# Altium schematic symbol library jlcpcb_2025_04_capacitors_extended_0603.schlib: 3668 symbols (part 17 of 20) (continued)
## GRM1885C1H112JA01D
designator C?  Capacitance: 1.1nF  (hidden comment: *)
Capacitor, Ceramic (MLCC), 1.1nF, ±5%, 50V, C0G, ±5%, SMD 0603; Manufacturer: Murata Electronics; Manufacturer Part Number: GRM1885C1H112JA01D; Package Size: 0603; JLCPCB Basic Part: No; JLCPCB Part Number: C710889; Supplier 1: LCSC; Category: Capacitors - MLCC; Supplier Part Number 1: C710889; Tolerance: ±5%; Voltage Rating: 50V; Temperature Coefficient: C0G; RoHS: Yes; ComponentLink1Description: Datasheet; ComponentLink1URL: https://wmsc.lcsc.com/wmsc/upload/file/pdf/v2/lcsc/2308111812_Murata-Electronics-GRM1885C1H112JA01D_C710889.pdf; ComponentLink2Description: JLCPCB Part URL; ComponentLink2URL: https://jlcpcb.com/partdetail/C710889; ComponentLink3Description: LCSC Part URL; ComponentLink3URL: https://lcsc.com/product-detail/Multilayer-Ceramic-Capacitors-MLCC---SMD-SMT_Murata-Electronics-Murata-Electronics-GRM1885C1H112JA01D_C710889.html
footprint CAP-0603 (0603 (1608M) Capacitor)
pins: 1, 2

## GRM1885C1H120FA01D
designator C?  Capacitance: 12pF  (hidden comment: *)
Capacitor, Ceramic (MLCC), 12pF, ±1%, 50V, C0G, ±1%, SMD 0603; Manufacturer: Murata Electronics; Manufacturer Part Number: GRM1885C1H120FA01D; Package Size: 0603; JLCPCB Basic Part: No; JLCPCB Part Number: C882527; Supplier 1: LCSC; Category: Capacitors - MLCC; Supplier Part Number 1: C882527; Tolerance: ±1%; Voltage Rating: 50V; Temperature Coefficient: C0G; RoHS: Yes; ComponentLink1Description: Datasheet; ComponentLink1URL: https://wmsc.lcsc.com/wmsc/upload/file/pdf/v2/lcsc/2206281830_Murata-Electronics-GRM1885C1H120FA01D_C882527.pdf; ComponentLink2Description: JLCPCB Part URL; ComponentLink2URL: https://jlcpcb.com/partdetail/C882527; ComponentLink3Description: LCSC Part URL; ComponentLink3URL: https://lcsc.com/product-detail/Multilayer-Ceramic-Capacitors-MLCC---SMD-SMT_Murata-Electronics-Murata-Electronics-GRM1885C1H120FA01D_C882527.html
footprint CAP-0603 (0603 (1608M) Capacitor)
pins: 1, 2

## GRM1885C1H120GA01D
designator C?  Capacitance: 12pF  (hidden comment: *)
Capacitor, Ceramic (MLCC), 12pF, ±2%, 50V, C0G, ±2%, SMD 0603; Manufacturer: Murata Electronics; Manufacturer Part Number: GRM1885C1H120GA01D; Package Size: 0603; JLCPCB Basic Part: No; JLCPCB Part Number: C426329; Supplier 1: LCSC; Category: Capacitors - MLCC; Supplier Part Number 1: C426329; Tolerance: ±2%; Voltage Rating: 50V; Temperature Coefficient: C0G; RoHS: Yes; ComponentLink1Description: Datasheet; ComponentLink1URL: https://wmsc.lcsc.com/wmsc/upload/file/pdf/v2/lcsc/2304140030_Murata-Electronics-GRM1885C1H120GA01D_C426329.pdf; ComponentLink2Description: JLCPCB Part URL; ComponentLink2URL: https://jlcpcb.com/partdetail/C426329; ComponentLink3Description: LCSC Part URL; ComponentLink3URL: https://lcsc.com/product-detail/Multilayer-Ceramic-Capacitors-MLCC---SMD-SMT_Murata-Electronics-Murata-Electronics-GRM1885C1H120GA01D_C426329.html
footprint CAP-0603 (0603 (1608M) Capacitor)
pins: 1, 2

## GRM1885C1H121GA01D
designator C?  Capacitance: 120pF  (hidden comment: *)
Capacitor, Ceramic (MLCC), 120pF, ±2%, null, null, ±2%, SMD 0603; Manufacturer: Murata Electronics; Manufacturer Part Number: GRM1885C1H121GA01D; Package Size: 0603; JLCPCB Basic Part: No; JLCPCB Part Number: C907973; Supplier 1: LCSC; Category: Capacitors - MLCC; Supplier Part Number 1: C907973; Tolerance: ±2%; Voltage Rating: null; Temperature Coefficient: null; RoHS: Yes; ComponentLink1Description: Datasheet; ComponentLink1URL: https://wmsc.lcsc.com/wmsc/upload/file/pdf/v2/lcsc/2201242100_Murata-Electronics-GRM1885C1H121GA01D_C907973.pdf; ComponentLink2Description: JLCPCB Part URL; ComponentLink2URL: https://jlcpcb.com/partdetail/C907973; ComponentLink3Description: LCSC Part URL; ComponentLink3URL: https://lcsc.com/product-detail/Multilayer-Ceramic-Capacitors-MLCC---SMD-SMT_Murata-Electronics-Murata-Electronics-GRM1885C1H121GA01D_C907973.html
footprint CAP-0603 (0603 (1608M) Capacitor)
pins: 1, 2

## GRM1885C1H121JA01D
designator C?  Capacitance: 120pF  (hidden comment: *)
Capacitor, Ceramic (MLCC), 120pF, ±5%, 50V, C0G, ±5%, SMD 0603; Manufacturer: Murata Electronics; Manufacturer Part Number: GRM1885C1H121JA01D; Package Size: 0603; JLCPCB Basic Part: No; JLCPCB Part Number: C85974; Supplier 1: LCSC; Category: Capacitors - MLCC; Supplier Part Number 1: C85974; Tolerance: ±5%; Voltage Rating: 50V; Temperature Coefficient: C0G; RoHS: Yes; ComponentLink1Description: Datasheet; ComponentLink1URL: https://wmsc.lcsc.com/wmsc/upload/file/pdf/v2/lcsc/2304140030_Murata-Electronics-GRM1885C1H121JA01D_C85974.pdf; ComponentLink2Description: JLCPCB Part URL; ComponentLink2URL: https://jlcpcb.com/partdetail/C85974; ComponentLink3Description: LCSC Part URL; ComponentLink3URL: https://lcsc.com/product-detail/Multilayer-Ceramic-Capacitors-MLCC---SMD-SMT_Murata-Electronics-Murata-Electronics-GRM1885C1H121JA01D_C85974.html
footprint CAP-0603 (0603 (1608M) Capacitor)
pins: 1, 2

## GRM1885C1H122JA01D
designator C?  Capacitance: 1.2nF  (hidden comment: *)
Capacitor, Ceramic (MLCC), 1.2nF, ±5%, 50V, C0G, ±5%, SMD 0603; Manufacturer: Murata Electronics; Manufacturer Part Number: GRM1885C1H122JA01D; Package Size: 0603; JLCPCB Basic Part: No; JLCPCB Part Number: C97876; Supplier 1: LCSC; Category: Capacitors - MLCC; Supplier Part Number 1: C97876; Tolerance: ±5%; Voltage Rating: 50V; Temperature Coefficient: C0G; RoHS: Yes; ComponentLink1Description: Datasheet; ComponentLink1URL: https://wmsc.lcsc.com/wmsc/upload/file/pdf/v2/lcsc/2304140030_Murata-Electronics-GRM1885C1H122JA01D_C97876.pdf; ComponentLink2Description: JLCPCB Part URL; ComponentLink2URL: https://jlcpcb.com/partdetail/C97876; ComponentLink3Description: LCSC Part URL; ComponentLink3URL: https://lcsc.com/product-detail/Multilayer-Ceramic-Capacitors-MLCC---SMD-SMT_Murata-Electronics-Murata-Electronics-GRM1885C1H122JA01D_C97876.html
footprint CAP-0603 (0603 (1608M) Capacitor)
pins: 1, 2

## GRM1885C1H131JA01D
designator C?  Capacitance: 130pF  (hidden comment: *)
Capacitor, Ceramic (MLCC), 130pF, ±5%, 50V, C0G, ±5%, SMD 0603; Manufacturer: Murata Electronics; Manufacturer Part Number: GRM1885C1H131JA01D; Package Size: 0603; JLCPCB Basic Part: No; JLCPCB Part Number: C441737; Supplier 1: LCSC; Category: Capacitors - MLCC; Supplier Part Number 1: C441737; Tolerance: ±5%; Voltage Rating: 50V; Temperature Coefficient: C0G; RoHS: Yes; ComponentLink1Description: Datasheet; ComponentLink1URL: https://wmsc.lcsc.com/wmsc/upload/file/pdf/v2/lcsc/2304140030_Murata-Electronics-GRM1885C1H131JA01D_C441737.pdf; ComponentLink2Description: JLCPCB Part URL; ComponentLink2URL: https://jlcpcb.com/partdetail/C441737; ComponentLink3Description: LCSC Part URL; ComponentLink3URL: https://lcsc.com/product-detail/Multilayer-Ceramic-Capacitors-MLCC---SMD-SMT_Murata-Electronics-Murata-Electronics-GRM1885C1H131JA01D_C441737.html
footprint CAP-0603 (0603 (1608M) Capacitor)
pins: 1, 2

## GRM1885C1H132JA01D
designator C?  Capacitance: 1.3nF  (hidden comment: *)
Capacitor, Ceramic (MLCC), 1.3nF, ±5%, 50V, null, ±5%, SMD 0603; Manufacturer: Murata Electronics; Manufacturer Part Number: GRM1885C1H132JA01D; Package Size: 0603; JLCPCB Basic Part: No; JLCPCB Part Number: C185598; Supplier 1: LCSC; Category: Capacitors - MLCC; Supplier Part Number 1: C185598; Tolerance: ±5%; Voltage Rating: 50V; Temperature Coefficient: null; RoHS: Yes; ComponentLink1Description: Datasheet; ComponentLink1URL: https://wmsc.lcsc.com/wmsc/upload/file/pdf/v2/lcsc/2304140030_Murata-Electronics-GRM1885C1H132JA01D_C185598.pdf; ComponentLink2Description: JLCPCB Part URL; ComponentLink2URL: https://jlcpcb.com/partdetail/C185598; ComponentLink3Description: LCSC Part URL; ComponentLink3URL: https://lcsc.com/product-detail/Multilayer-Ceramic-Capacitors-MLCC---SMD-SMT_Murata-Electronics-Murata-Electronics-GRM1885C1H132JA01D_C185598.html
footprint CAP-0603 (0603 (1608M) Capacitor)
pins: 1, 2

## GRM1885C1H150JA01D
designator C?  Capacitance: 15pF  (hidden comment: *)
Capacitor, Ceramic (MLCC), 15pF, ±5%, 50V, C0G, ±5%, SMD 0603; Manufacturer: Murata Electronics; Manufacturer Part Number: GRM1885C1H150JA01D; Package Size: 0603; JLCPCB Basic Part: No; JLCPCB Part Number: C71651; Supplier 1: LCSC; Category: Capacitors - MLCC; Supplier Part Number 1: C71651; Tolerance: ±5%; Voltage Rating: 50V; Temperature Coefficient: C0G; RoHS: Yes; ComponentLink1Description: Datasheet; ComponentLink1URL: https://wmsc.lcsc.com/wmsc/upload/file/pdf/v2/lcsc/1811122015_Murata-Electronics-GRM1885C1H150JA01D_C71651.pdf; ComponentLink2Description: JLCPCB Part URL; ComponentLink2URL: https://jlcpcb.com/partdetail/C71651; ComponentLink3Description: LCSC Part URL; ComponentLink3URL: https://lcsc.com/product-detail/Multilayer-Ceramic-Capacitors-MLCC---SMD-SMT_Murata-Electronics-Murata-Electronics-GRM1885C1H150JA01D_C71651.html
footprint CAP-0603 (0603 (1608M) Capacitor)
pins: 1, 2

## GRM1885C1H151GA01D
designator C?  Capacitance: 150pF  (hidden comment: *)
Capacitor, Ceramic (MLCC), 150pF, ±2%, 50V, C0G, ±2%, SMD 0603; Manufacturer: Murata Electronics; Manufacturer Part Number: GRM1885C1H151GA01D; Package Size: 0603; JLCPCB Basic Part: No; JLCPCB Part Number: C3869296; Supplier 1: LCSC; Category: Capacitors - MLCC; Supplier Part Number 1: C3869296; Tolerance: ±2%; Voltage Rating: 50V; Temperature Coefficient: C0G; RoHS: Yes; ComponentLink1Description: Datasheet; ComponentLink1URL: https://wmsc.lcsc.com/wmsc/upload/file/pdf/v2/lcsc/2401250435_Murata-Electronics-GRM1885C1H151GA01D_C3869296.pdf; ComponentLink2Description: JLCPCB Part URL; ComponentLink2URL: https://jlcpcb.com/partdetail/C3869296; ComponentLink3Description: LCSC Part URL; ComponentLink3URL: https://lcsc.com/product-detail/Multilayer-Ceramic-Capacitors-MLCC---SMD-SMT_Murata-Electronics-Murata-Electronics-GRM1885C1H151GA01D_C3869296.html
footprint CAP-0603 (0603 (1608M) Capacitor)
pins: 1, 2

## GRM1885C1H152JA01D
designator C?  Capacitance: 1.5nF  (hidden comment: *)
Capacitor, Ceramic (MLCC), 1.5nF, ±5%, 50V, C0G, ±5%, SMD 0603; Manufacturer: Murata Electronics; Manufacturer Part Number: GRM1885C1H152JA01D; Package Size: 0603; JLCPCB Basic Part: No; JLCPCB Part Number: C162204; Supplier 1: LCSC; Category: Capacitors - MLCC; Supplier Part Number 1: C162204; Tolerance: ±5%; Voltage Rating: 50V; Temperature Coefficient: C0G; RoHS: Yes; ComponentLink1Description: Datasheet; ComponentLink1URL: https://wmsc.lcsc.com/wmsc/upload/file/pdf/v2/lcsc/2304140030_Murata-Electronics-GRM1885C1H152JA01D_C162204.pdf; ComponentLink2Description: JLCPCB Part URL; ComponentLink2URL: https://jlcpcb.com/partdetail/C162204; ComponentLink3Description: LCSC Part URL; ComponentLink3URL: https://lcsc.com/product-detail/Multilayer-Ceramic-Capacitors-MLCC---SMD-SMT_Murata-Electronics-Murata-Electronics-GRM1885C1H152JA01D_C162204.html
footprint CAP-0603 (0603 (1608M) Capacitor)
pins: 1, 2

## GRM1885C1H161JA01D
designator C?  Capacitance: 160pF  (hidden comment: *)
Capacitor, Ceramic (MLCC), 160pF, ±5%, null, null, ±5%, SMD 0603; Manufacturer: Murata Electronics; Manufacturer Part Number: GRM1885C1H161JA01D; Package Size: 0603; JLCPCB Basic Part: No; JLCPCB Part Number: C710893; Supplier 1: LCSC; Category: Capacitors - MLCC; Supplier Part Number 1: C710893; Tolerance: ±5%; Voltage Rating: null; Temperature Coefficient: null; RoHS: Yes; ComponentLink1Description: Datasheet; ComponentLink1URL: https://wmsc.lcsc.com/wmsc/upload/file/pdf/v2/lcsc/2009181535_Murata-Electronics-GRM1885C1H161JA01D_C710893.pdf; ComponentLink2Description: JLCPCB Part URL; ComponentLink2URL: https://jlcpcb.com/partdetail/C710893; ComponentLink3Description: LCSC Part URL; ComponentLink3URL: https://lcsc.com/product-detail/Multilayer-Ceramic-Capacitors-MLCC---SMD-SMT_Murata-Electronics-Murata-Electronics-GRM1885C1H161JA01D_C710893.html
footprint CAP-0603 (0603 (1608M) Capacitor)
pins: 1, 2

## GRM1885C1H162JA01D
designator C?  Capacitance: 1.6nF  (hidden comment: *)
Capacitor, Ceramic (MLCC), 1.6nF, ±5%, 50V, C0G, ±5%, SMD 0603; Manufacturer: Murata Electronics; Manufacturer Part Number: GRM1885C1H162JA01D; Package Size: 0603; JLCPCB Basic Part: No; JLCPCB Part Number: C437532; Supplier 1: LCSC; Category: Capacitors - MLCC; Supplier Part Number 1: C437532; Tolerance: ±5%; Voltage Rating: 50V; Temperature Coefficient: C0G; RoHS: Yes; ComponentLink1Description: Datasheet; ComponentLink1URL: https://wmsc.lcsc.com/wmsc/upload/file/pdf/v2/lcsc/2304140030_Murata-Electronics-GRM1885C1H162JA01D_C437532.pdf; ComponentLink2Description: JLCPCB Part URL; ComponentLink2URL: https://jlcpcb.com/partdetail/C437532; ComponentLink3Description: LCSC Part URL; ComponentLink3URL: https://lcsc.com/product-detail/Multilayer-Ceramic-Capacitors-MLCC---SMD-SMT_Murata-Electronics-Murata-Electronics-GRM1885C1H162JA01D_C437532.html
footprint CAP-0603 (0603 (1608M) Capacitor)
pins: 1, 2

## GRM1885C1H182FA01D
designator C?  Capacitance: 1.8nF  (hidden comment: *)
Capacitor, Ceramic (MLCC), 1.8nF, ±1%, 50V, C0G, ±1%, SMD 0603; Manufacturer: Murata Electronics; Manufacturer Part Number: GRM1885C1H182FA01D; Package Size: 0603; JLCPCB Basic Part: No; JLCPCB Part Number: C882525; Supplier 1: LCSC; Category: Capacitors - MLCC; Supplier Part Number 1: C882525; Tolerance: ±1%; Voltage Rating: 50V; Temperature Coefficient: C0G; RoHS: Yes; ComponentLink1Description: Datasheet; ComponentLink1URL: https://wmsc.lcsc.com/wmsc/upload/file/pdf/v2/lcsc/2206301900_Murata-Electronics-GRM1885C1H182FA01D_C882525.pdf; ComponentLink2Description: JLCPCB Part URL; ComponentLink2URL: https://jlcpcb.com/partdetail/C882525; ComponentLink3Description: LCSC Part URL; ComponentLink3URL: https://lcsc.com/product-detail/Multilayer-Ceramic-Capacitors-MLCC---SMD-SMT_Murata-Electronics-Murata-Electronics-GRM1885C1H182FA01D_C882525.html
footprint CAP-0603 (0603 (1608M) Capacitor)
pins: 1, 2

## GRM1885C1H182JA01D
designator C?  Capacitance: 1.8nF  (hidden comment: *)
Capacitor, Ceramic (MLCC), 1.8nF, ±5%, 50V, C0G, ±5%, SMD 0603; Manufacturer: Murata Electronics; Manufacturer Part Number: GRM1885C1H182JA01D; Package Size: 0603; JLCPCB Basic Part: No; JLCPCB Part Number: C97878; Supplier 1: LCSC; Category: Capacitors - MLCC; Supplier Part Number 1: C97878; Tolerance: ±5%; Voltage Rating: 50V; Temperature Coefficient: C0G; RoHS: Yes; ComponentLink1Description: Datasheet; ComponentLink1URL: https://wmsc.lcsc.com/wmsc/upload/file/pdf/v2/lcsc/2304140030_Murata-Electronics-GRM1885C1H182JA01D_C97878.pdf; ComponentLink2Description: JLCPCB Part URL; ComponentLink2URL: https://jlcpcb.com/partdetail/C97878; ComponentLink3Description: LCSC Part URL; ComponentLink3URL: https://lcsc.com/product-detail/Multilayer-Ceramic-Capacitors-MLCC---SMD-SMT_Murata-Electronics-Murata-Electronics-GRM1885C1H182JA01D_C97878.html
footprint CAP-0603 (0603 (1608M) Capacitor)
pins: 1, 2

## GRM1885C1H200JA01D
designator C?  Capacitance: 20pF  (hidden comment: *)
Capacitor, Ceramic (MLCC), 20pF, ±5%, 50V, C0G, ±5%, SMD 0603; Manufacturer: Murata Electronics; Manufacturer Part Number: GRM1885C1H200JA01D; Package Size: 0603; JLCPCB Basic Part: No; JLCPCB Part Number: C77030; Supplier 1: LCSC; Category: Capacitors - MLCC; Supplier Part Number 1: C77030; Tolerance: ±5%; Voltage Rating: 50V; Temperature Coefficient: C0G; RoHS: Yes; ComponentLink1Description: Datasheet; ComponentLink1URL: https://wmsc.lcsc.com/wmsc/upload/file/pdf/v2/lcsc/2304140030_Murata-Electronics-GRM1885C1H200JA01D_C77030.pdf; ComponentLink2Description: JLCPCB Part URL; ComponentLink2URL: https://jlcpcb.com/partdetail/C77030; ComponentLink3Description: LCSC Part URL; ComponentLink3URL: https://lcsc.com/product-detail/Multilayer-Ceramic-Capacitors-MLCC---SMD-SMT_Murata-Electronics-Murata-Electronics-GRM1885C1H200JA01D_C77030.html
footprint CAP-0603 (0603 (1608M) Capacitor)
pins: 1, 2

## GRM1885C1H201JA01D
designator C?  Capacitance: 200pF  (hidden comment: *)
Capacitor, Ceramic (MLCC), 200pF, ±5%, 50V, C0G, ±5%, SMD 0603; Manufacturer: Murata Electronics; Manufacturer Part Number: GRM1885C1H201JA01D; Package Size: 0603; JLCPCB Basic Part: No; JLCPCB Part Number: C77390; Supplier 1: LCSC; Category: Capacitors - MLCC; Supplier Part Number 1: C77390; Tolerance: ±5%; Voltage Rating: 50V; Temperature Coefficient: C0G; RoHS: Yes; ComponentLink1Description: Datasheet; ComponentLink1URL: https://wmsc.lcsc.com/wmsc/upload/file/pdf/v2/lcsc/1912111437_Murata-Electronics-GRM1885C1H201JA01D_C77390.pdf; ComponentLink2Description: JLCPCB Part URL; ComponentLink2URL: https://jlcpcb.com/partdetail/C77390; ComponentLink3Description: LCSC Part URL; ComponentLink3URL: https://lcsc.com/product-detail/Multilayer-Ceramic-Capacitors-MLCC---SMD-SMT_Murata-Electronics-Murata-Electronics-GRM1885C1H201JA01D_C77390.html
footprint CAP-0603 (0603 (1608M) Capacitor)
pins: 1, 2

## GRM1885C1H202JA01D
designator C?  Capacitance: 2nF  (hidden comment: *)
Capacitor, Ceramic (MLCC), 2nF, ±5%, 50V, null, ±5%, SMD 0603; Manufacturer: Murata Electronics; Manufacturer Part Number: GRM1885C1H202JA01D; Package Size: 0603; JLCPCB Basic Part: No; JLCPCB Part Number: C2168932; Supplier 1: LCSC; Category: Capacitors - MLCC; Supplier Part Number 1: C2168932; Tolerance: ±5%; Voltage Rating: 50V; Temperature Coefficient: null; RoHS: Yes; ComponentLink1Description: Datasheet; ComponentLink1URL: https://wmsc.lcsc.com/wmsc/upload/file/pdf/v2/lcsc/2308111716_Murata-Electronics-GRM1885C1H202JA01D_C2168932.pdf; ComponentLink2Description: JLCPCB Part URL; ComponentLink2URL: https://jlcpcb.com/partdetail/C2168932; ComponentLink3Description: LCSC Part URL; ComponentLink3URL: https://lcsc.com/product-detail/Multilayer-Ceramic-Capacitors-MLCC---SMD-SMT_Murata-Electronics-Murata-Electronics-GRM1885C1H202JA01D_C2168932.html
footprint CAP-0603 (0603 (1608M) Capacitor)
pins: 1, 2

## GRM1885C1H221FA01D
designator C?  Capacitance: 220pF  (hidden comment: *)
Capacitor, Ceramic (MLCC), 220pF, ±1%, ±1%, SMD 0603; Manufacturer: Murata Electronics; Manufacturer Part Number: GRM1885C1H221FA01D; Package Size: 0603; JLCPCB Basic Part: No; JLCPCB Part Number: C782155; Supplier 1: LCSC; Category: Capacitors - MLCC; Supplier Part Number 1: C782155; Tolerance: ±1%; RoHS: Yes; ComponentLink1Description: Datasheet; ComponentLink1URL: https://wmsc.lcsc.com/wmsc/upload/file/pdf/v2/lcsc/2304140030_Murata-Electronics-GRM1885C1H221FA01D_C782155.pdf; ComponentLink2Description: JLCPCB Part URL; ComponentLink2URL: https://jlcpcb.com/partdetail/C782155; ComponentLink3Description: LCSC Part URL; ComponentLink3URL: https://lcsc.com/product-detail/Multilayer-Ceramic-Capacitors-MLCC---SMD-SMT_Murata-Electronics-Murata-Electronics-GRM1885C1H221FA01D_C782155.html
footprint CAP-0603 (0603 (1608M) Capacitor)
pins: 1, 2

## GRM1885C1H221GA01D
designator C?  Capacitance: 220pF  (hidden comment: *)
Capacitor, Ceramic (MLCC), 220pF, ±2%, 50V, null, ±2%, SMD 0603; Manufacturer: Murata Electronics; Manufacturer Part Number: GRM1885C1H221GA01D; Package Size: 0603; JLCPCB Basic Part: No; JLCPCB Part Number: C440180; Supplier 1: LCSC; Category: Capacitors - MLCC; Supplier Part Number 1: C440180; Tolerance: ±2%; Voltage Rating: 50V; Temperature Coefficient: null; RoHS: Yes; ComponentLink1Description: Datasheet; ComponentLink1URL: https://wmsc.lcsc.com/wmsc/upload/file/pdf/v2/lcsc/2304140030_Murata-Electronics-GRM1885C1H221GA01D_C440180.pdf; ComponentLink2Description: JLCPCB Part URL; ComponentLink2URL: https://jlcpcb.com/partdetail/C440180; ComponentLink3Description: LCSC Part URL; ComponentLink3URL: https://lcsc.com/product-detail/Multilayer-Ceramic-Capacitors-MLCC---SMD-SMT_Murata-Electronics-Murata-Electronics-GRM1885C1H221GA01D_C440180.html
footprint CAP-0603 (0603 (1608M) Capacitor)
pins: 1, 2

## GRM1885C1H222FA01D
designator C?  Capacitance: 2.2nF  (hidden comment: *)
Capacitor, Ceramic (MLCC), 2.2nF, ±1%, 50V, C0G, ±1%, SMD 0603; Manufacturer: Murata Electronics; Manufacturer Part Number: GRM1885C1H222FA01D; Package Size: 0603; JLCPCB Basic Part: No; JLCPCB Part Number: C882523; Supplier 1: LCSC; Category: Capacitors - MLCC; Supplier Part Number 1: C882523; Tolerance: ±1%; Voltage Rating: 50V; Temperature Coefficient: C0G; RoHS: Yes; ComponentLink1Description: Datasheet; ComponentLink1URL: https://wmsc.lcsc.com/wmsc/upload/file/pdf/v2/lcsc/2206301900_Murata-Electronics-GRM1885C1H222FA01D_C882523.pdf; ComponentLink2Description: JLCPCB Part URL; ComponentLink2URL: https://jlcpcb.com/partdetail/C882523; ComponentLink3Description: LCSC Part URL; ComponentLink3URL: https://lcsc.com/product-detail/Multilayer-Ceramic-Capacitors-MLCC---SMD-SMT_Murata-Electronics-Murata-Electronics-GRM1885C1H222FA01D_C882523.html
footprint CAP-0603 (0603 (1608M) Capacitor)
pins: 1, 2

## GRM1885C1H222GA01D
designator C?  Capacitance: 2.2nF  (hidden comment: *)
Capacitor, Ceramic (MLCC), 2.2nF, ±2%, ±2%, SMD 0603; Manufacturer: Murata Electronics; Manufacturer Part Number: GRM1885C1H222GA01D; Package Size: 0603; JLCPCB Basic Part: No; JLCPCB Part Number: C913540; Supplier 1: LCSC; Category: Capacitors - MLCC; Supplier Part Number 1: C913540; Tolerance: ±2%; RoHS: Yes; ComponentLink1Description: Datasheet; ComponentLink2Description: JLCPCB Part URL; ComponentLink2URL: https://jlcpcb.com/partdetail/C913540; ComponentLink3Description: LCSC Part URL; ComponentLink3URL: https://lcsc.com/product-detail/Multilayer-Ceramic-Capacitors-MLCC---SMD-SMT_Murata-Electronics-Murata-Electronics-GRM1885C1H222GA01D_C913540.html
footprint CAP-0603 (0603 (1608M) Capacitor)
pins: 1, 2

## GRM1885C1H222JA01D
designator C?  Capacitance: 2.2nF  (hidden comment: *)
Capacitor, Ceramic (MLCC), 2.2nF, ±5%, 50V, C0G, ±5%, SMD 0603; Manufacturer: Murata Electronics; Manufacturer Part Number: GRM1885C1H222JA01D; Package Size: 0603; JLCPCB Basic Part: No; JLCPCB Part Number: C77033; Supplier 1: LCSC; Category: Capacitors - MLCC; Supplier Part Number 1: C77033; Tolerance: ±5%; Voltage Rating: 50V; Temperature Coefficient: C0G; RoHS: Yes; ComponentLink1Description: Datasheet; ComponentLink1URL: https://wmsc.lcsc.com/wmsc/upload/file/pdf/v2/lcsc/2304140030_Murata-Electronics-GRM1885C1H222JA01D_C77033.pdf; ComponentLink2Description: JLCPCB Part URL; ComponentLink2URL: https://jlcpcb.com/partdetail/C77033; ComponentLink3Description: LCSC Part URL; ComponentLink3URL: https://lcsc.com/product-detail/Multilayer-Ceramic-Capacitors-MLCC---SMD-SMT_Murata-Electronics-Murata-Electronics-GRM1885C1H222JA01D_C77033.html
footprint CAP-0603 (0603 (1608M) Capacitor)
pins: 1, 2

## GRM1885C1H222JA01J
designator C?  Capacitance: 2.2nF  (hidden comment: *)
Capacitor, Ceramic (MLCC), 2.2nF, ±5%, 50V, null, ±5%, SMD 0603; Manufacturer: Murata Electronics; Manufacturer Part Number: GRM1885C1H222JA01J; Package Size: 0603; JLCPCB Basic Part: No; JLCPCB Part Number: C2168957; Supplier 1: LCSC; Category: Capacitors - MLCC; Supplier Part Number 1: C2168957; Tolerance: ±5%; Voltage Rating: 50V; Temperature Coefficient: null; RoHS: Yes; ComponentLink1Description: Datasheet; ComponentLink1URL: https://wmsc.lcsc.com/wmsc/upload/file/pdf/v2/lcsc/2202040330_Murata-Electronics-GRM1885C1H222JA01J_C2168957.pdf; ComponentLink2Description: JLCPCB Part URL; ComponentLink2URL: https://jlcpcb.com/partdetail/C2168957; ComponentLink3Description: LCSC Part URL; ComponentLink3URL: https://lcsc.com/product-detail/Multilayer-Ceramic-Capacitors-MLCC---SMD-SMT_Murata-Electronics-Murata-Electronics-GRM1885C1H222JA01J_C2168957.html
footprint CAP-0603 (0603 (1608M) Capacitor)
pins: 1, 2

## GRM1885C1H240JA01D
designator C?  Capacitance: 24pF  (hidden comment: *)
Capacitor, Ceramic (MLCC), 24pF, ±5%, 50V, C0G, ±5%, SMD 0603; Manufacturer: Murata Electronics; Manufacturer Part Number: GRM1885C1H240JA01D; Package Size: 0603; JLCPCB Basic Part: No; JLCPCB Part Number: C162214; Supplier 1: LCSC; Category: Capacitors - MLCC; Supplier Part Number 1: C162214; Tolerance: ±5%; Voltage Rating: 50V; Temperature Coefficient: C0G; RoHS: Yes; ComponentLink1Description: Datasheet; ComponentLink1URL: https://wmsc.lcsc.com/wmsc/upload/file/pdf/v2/lcsc/2001071808_Murata-Electronics-GRM1885C1H240JA01D_C162214.pdf; ComponentLink2Description: JLCPCB Part URL; ComponentLink2URL: https://jlcpcb.com/partdetail/C162214; ComponentLink3Description: LCSC Part URL; ComponentLink3URL: https://lcsc.com/product-detail/Multilayer-Ceramic-Capacitors-MLCC---SMD-SMT_Murata-Electronics-Murata-Electronics-GRM1885C1H240JA01D_C162214.html
footprint CAP-0603 (0603 (1608M) Capacitor)
pins: 1, 2

## GRM1885C1H241JA01D
designator C?  Capacitance: 240pF  (hidden comment: *)
Capacitor, Ceramic (MLCC), 240pF, ±5%, 50V, C0G, ±5%, SMD 0603; Manufacturer: Murata Electronics; Manufacturer Part Number: GRM1885C1H241JA01D; Package Size: 0603; JLCPCB Basic Part: No; JLCPCB Part Number: C185593; Supplier 1: LCSC; Category: Capacitors - MLCC; Supplier Part Number 1: C185593; Tolerance: ±5%; Voltage Rating: 50V; Temperature Coefficient: C0G; RoHS: Yes; ComponentLink1Description: Datasheet; ComponentLink1URL: https://wmsc.lcsc.com/wmsc/upload/file/pdf/v2/lcsc/1810311136_Murata-Electronics-GRM1885C1H241JA01D_C185593.pdf; ComponentLink2Description: JLCPCB Part URL; ComponentLink2URL: https://jlcpcb.com/partdetail/C185593; ComponentLink3Description: LCSC Part URL; ComponentLink3URL: https://lcsc.com/product-detail/Multilayer-Ceramic-Capacitors-MLCC---SMD-SMT_Murata-Electronics-Murata-Electronics-GRM1885C1H241JA01D_C185593.html
footprint CAP-0603 (0603 (1608M) Capacitor)
pins: 1, 2

## GRM1885C1H242JA01D
designator C?  Capacitance: 2.4nF  (hidden comment: *)
Capacitor, Ceramic (MLCC), 2.4nF, ±5%, 50V, C0G, ±5%, SMD 0603; Manufacturer: Murata Electronics; Manufacturer Part Number: GRM1885C1H242JA01D; Package Size: 0603; JLCPCB Basic Part: No; JLCPCB Part Number: C710895; Supplier 1: LCSC; Category: Capacitors - MLCC; Supplier Part Number 1: C710895; Tolerance: ±5%; Voltage Rating: 50V; Temperature Coefficient: C0G; RoHS: Yes; ComponentLink1Description: Datasheet; ComponentLink1URL: https://wmsc.lcsc.com/wmsc/upload/file/pdf/v2/lcsc/2308111812_Murata-Electronics-GRM1885C1H242JA01D_C710895.pdf; ComponentLink2Description: JLCPCB Part URL; ComponentLink2URL: https://jlcpcb.com/partdetail/C710895; ComponentLink3Description: LCSC Part URL; ComponentLink3URL: https://lcsc.com/product-detail/Multilayer-Ceramic-Capacitors-MLCC---SMD-SMT_Murata-Electronics-Murata-Electronics-GRM1885C1H242JA01D_C710895.html
footprint CAP-0603 (0603 (1608M) Capacitor)
pins: 1, 2

## GRM1885C1H270FA01D
designator C?  Capacitance: 27pF  (hidden comment: *)
Capacitor, Ceramic (MLCC), 27pF, ±1%, 50V, C0G, ±1%, SMD 0603; Manufacturer: Murata Electronics; Manufacturer Part Number: GRM1885C1H270FA01D; Package Size: 0603; JLCPCB Basic Part: No; JLCPCB Part Number: C162215; Supplier 1: LCSC; Category: Capacitors - MLCC; Supplier Part Number 1: C162215; Tolerance: ±1%; Voltage Rating: 50V; Temperature Coefficient: C0G; RoHS: Yes; ComponentLink1Description: Datasheet; ComponentLink1URL: https://wmsc.lcsc.com/wmsc/upload/file/pdf/v2/lcsc/2304140030_Murata-Electronics-GRM1885C1H270FA01D_C162215.pdf; ComponentLink2Description: JLCPCB Part URL; ComponentLink2URL: https://jlcpcb.com/partdetail/C162215; ComponentLink3Description: LCSC Part URL; ComponentLink3URL: https://lcsc.com/product-detail/Multilayer-Ceramic-Capacitors-MLCC---SMD-SMT_Murata-Electronics-Murata-Electronics-GRM1885C1H270FA01D_C162215.html
footprint CAP-0603 (0603 (1608M) Capacitor)
pins: 1, 2

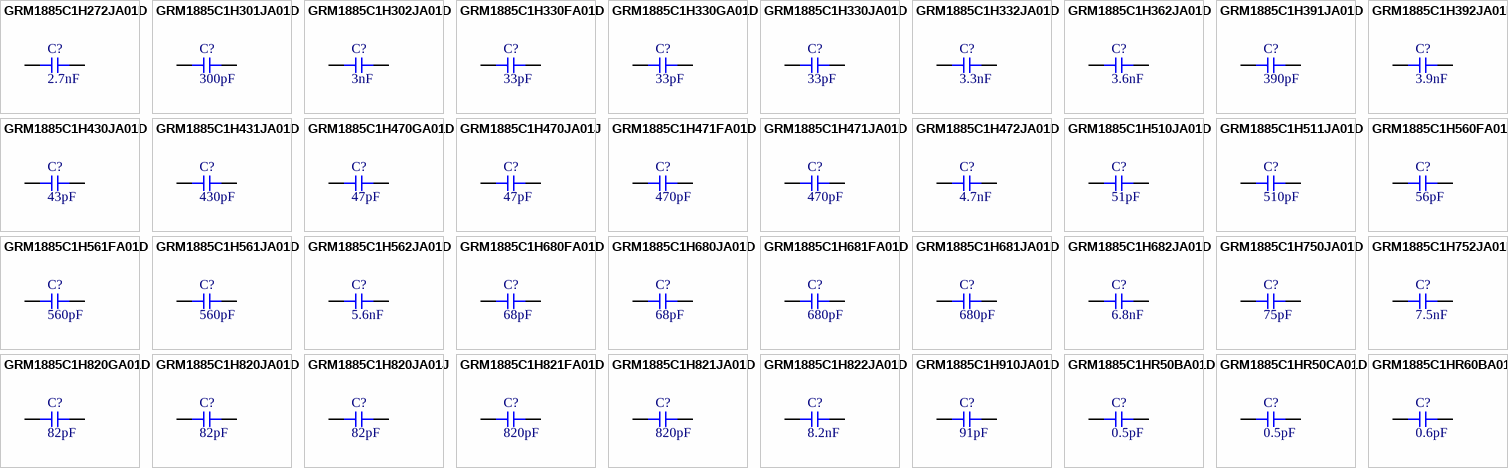
[diagram p78: symbols GRM1885C1H272JA01D to GRM1885C1HR60BA01D]

## GRM1885C1H272JA01D
designator C?  Capacitance: 2.7nF  (hidden comment: *)
Capacitor, Ceramic (MLCC), 2.7nF, ±5%, 50V, C0G, ±5%, SMD 0603; Manufacturer: Murata Electronics; Manufacturer Part Number: GRM1885C1H272JA01D; Package Size: 0603; JLCPCB Basic Part: No; JLCPCB Part Number: C77034; Supplier 1: LCSC; Category: Capacitors - MLCC; Supplier Part Number 1: C77034; Tolerance: ±5%; Voltage Rating: 50V; Temperature Coefficient: C0G; RoHS: Yes; ComponentLink1Description: Datasheet; ComponentLink1URL: https://wmsc.lcsc.com/wmsc/upload/file/pdf/v2/lcsc/2304140030_Murata-Electronics-GRM1885C1H272JA01D_C77034.pdf; ComponentLink2Description: JLCPCB Part URL; ComponentLink2URL: https://jlcpcb.com/partdetail/C77034; ComponentLink3Description: LCSC Part URL; ComponentLink3URL: https://lcsc.com/product-detail/Multilayer-Ceramic-Capacitors-MLCC---SMD-SMT_Murata-Electronics-Murata-Electronics-GRM1885C1H272JA01D_C77034.html
footprint CAP-0603 (0603 (1608M) Capacitor)
pins: 1, 2

## GRM1885C1H301JA01D
designator C?  Capacitance: 300pF  (hidden comment: *)
Capacitor, Ceramic (MLCC), 300pF, ±5%, null, null, ±5%, SMD 0603; Manufacturer: Murata Electronics; Manufacturer Part Number: GRM1885C1H301JA01D; Package Size: 0603; JLCPCB Basic Part: No; JLCPCB Part Number: C701310; Supplier 1: LCSC; Category: Capacitors - MLCC; Supplier Part Number 1: C701310; Tolerance: ±5%; Voltage Rating: null; Temperature Coefficient: null; RoHS: Yes; ComponentLink1Description: Datasheet; ComponentLink1URL: https://wmsc.lcsc.com/wmsc/upload/file/pdf/v2/lcsc/2304140030_Murata-Electronics-GRM1885C1H301JA01D_C701310.pdf; ComponentLink2Description: JLCPCB Part URL; ComponentLink2URL: https://jlcpcb.com/partdetail/C701310; ComponentLink3Description: LCSC Part URL; ComponentLink3URL: https://lcsc.com/product-detail/Multilayer-Ceramic-Capacitors-MLCC---SMD-SMT_Murata-Electronics-Murata-Electronics-GRM1885C1H301JA01D_C701310.html
footprint CAP-0603 (0603 (1608M) Capacitor)
pins: 1, 2

## GRM1885C1H302JA01D
designator C?  Capacitance: 3nF  (hidden comment: *)
Capacitor, Ceramic (MLCC), 3nF, ±5%, null, null, ±5%, SMD 0603; Manufacturer: Murata Electronics; Manufacturer Part Number: GRM1885C1H302JA01D; Package Size: 0603; JLCPCB Basic Part: No; JLCPCB Part Number: C701288; Supplier 1: LCSC; Category: Capacitors - MLCC; Supplier Part Number 1: C701288; Tolerance: ±5%; Voltage Rating: null; Temperature Coefficient: null; RoHS: Yes; ComponentLink1Description: Datasheet; ComponentLink1URL: https://wmsc.lcsc.com/wmsc/upload/file/pdf/v2/lcsc/2304140030_Murata-Electronics-GRM1885C1H302JA01D_C701288.pdf; ComponentLink2Description: JLCPCB Part URL; ComponentLink2URL: https://jlcpcb.com/partdetail/C701288; ComponentLink3Description: LCSC Part URL; ComponentLink3URL: https://lcsc.com/product-detail/Multilayer-Ceramic-Capacitors-MLCC---SMD-SMT_Murata-Electronics-Murata-Electronics-GRM1885C1H302JA01D_C701288.html
footprint CAP-0603 (0603 (1608M) Capacitor)
pins: 1, 2

## GRM1885C1H330FA01D
designator C?  Capacitance: 33pF  (hidden comment: *)
Capacitor, Ceramic (MLCC), 33pF, ±1%, ±1%, SMD 0603; Manufacturer: Murata Electronics; Manufacturer Part Number: GRM1885C1H330FA01D; Package Size: 0603; JLCPCB Basic Part: No; JLCPCB Part Number: C882522; Supplier 1: LCSC; Category: Capacitors - MLCC; Supplier Part Number 1: C882522; Tolerance: ±1%; RoHS: Yes; ComponentLink1Description: Datasheet; ComponentLink1URL: https://wmsc.lcsc.com/wmsc/upload/file/pdf/v2/lcsc/2012211538_Murata-Electronics-GRM1885C1H330FA01D_C882522.pdf; ComponentLink2Description: JLCPCB Part URL; ComponentLink2URL: https://jlcpcb.com/partdetail/C882522; ComponentLink3Description: LCSC Part URL; ComponentLink3URL: https://lcsc.com/product-detail/Multilayer-Ceramic-Capacitors-MLCC---SMD-SMT_Murata-Electronics-Murata-Electronics-GRM1885C1H330FA01D_C882522.html
footprint CAP-0603 (0603 (1608M) Capacitor)
pins: 1, 2

## GRM1885C1H330GA01D
designator C?  Capacitance: 33pF  (hidden comment: *)
Capacitor, Ceramic (MLCC), 33pF, ±2%, null, null, ±2%, SMD 0603; Manufacturer: Murata Electronics; Manufacturer Part Number: GRM1885C1H330GA01D; Package Size: 0603; JLCPCB Basic Part: No; JLCPCB Part Number: C426330; Supplier 1: LCSC; Category: Capacitors - MLCC; Supplier Part Number 1: C426330; Tolerance: ±2%; Voltage Rating: null; Temperature Coefficient: null; RoHS: Yes; ComponentLink1Description: Datasheet; ComponentLink1URL: https://wmsc.lcsc.com/wmsc/upload/file/pdf/v2/lcsc/2304140030_Murata-Electronics-GRM1885C1H330GA01D_C426330.pdf; ComponentLink2Description: JLCPCB Part URL; ComponentLink2URL: https://jlcpcb.com/partdetail/C426330; ComponentLink3Description: LCSC Part URL; ComponentLink3URL: https://lcsc.com/product-detail/Multilayer-Ceramic-Capacitors-MLCC---SMD-SMT_Murata-Electronics-Murata-Electronics-GRM1885C1H330GA01D_C426330.html
footprint CAP-0603 (0603 (1608M) Capacitor)
pins: 1, 2

## GRM1885C1H330JA01D
designator C?  Capacitance: 33pF  (hidden comment: *)
Capacitor, Ceramic (MLCC), 33pF, ±5%, 50V, C0G, ±5%, SMD 0603; Manufacturer: Murata Electronics; Manufacturer Part Number: GRM1885C1H330JA01D; Package Size: 0603; JLCPCB Basic Part: No; JLCPCB Part Number: C77035; Supplier 1: LCSC; Category: Capacitors - MLCC; Supplier Part Number 1: C77035; Tolerance: ±5%; Voltage Rating: 50V; Temperature Coefficient: C0G; RoHS: Yes; ComponentLink1Description: Datasheet; ComponentLink1URL: https://wmsc.lcsc.com/wmsc/upload/file/pdf/v2/lcsc/2304140030_Murata-Electronics-GRM1885C1H330JA01D_C77035.pdf; ComponentLink2Description: JLCPCB Part URL; ComponentLink2URL: https://jlcpcb.com/partdetail/C77035; ComponentLink3Description: LCSC Part URL; ComponentLink3URL: https://lcsc.com/product-detail/Multilayer-Ceramic-Capacitors-MLCC---SMD-SMT_Murata-Electronics-Murata-Electronics-GRM1885C1H330JA01D_C77035.html
footprint CAP-0603 (0603 (1608M) Capacitor)
pins: 1, 2

## GRM1885C1H332JA01D
designator C?  Capacitance: 3.3nF  (hidden comment: *)
Capacitor, Ceramic (MLCC), 3.3nF, ±5%, 50V, C0G, ±5%, SMD 0603; Manufacturer: Murata Electronics; Manufacturer Part Number: GRM1885C1H332JA01D; Package Size: 0603; JLCPCB Basic Part: No; JLCPCB Part Number: C77036; Supplier 1: LCSC; Category: Capacitors - MLCC; Supplier Part Number 1: C77036; Tolerance: ±5%; Voltage Rating: 50V; Temperature Coefficient: C0G; RoHS: Yes; ComponentLink1Description: Datasheet; ComponentLink1URL: https://wmsc.lcsc.com/wmsc/upload/file/pdf/v2/lcsc/2304140030_Murata-Electronics-GRM1885C1H332JA01D_C77036.pdf; ComponentLink2Description: JLCPCB Part URL; ComponentLink2URL: https://jlcpcb.com/partdetail/C77036; ComponentLink3Description: LCSC Part URL; ComponentLink3URL: https://lcsc.com/product-detail/Multilayer-Ceramic-Capacitors-MLCC---SMD-SMT_Murata-Electronics-Murata-Electronics-GRM1885C1H332JA01D_C77036.html
footprint CAP-0603 (0603 (1608M) Capacitor)
pins: 1, 2

## GRM1885C1H362JA01D
designator C?  Capacitance: 3.6nF  (hidden comment: *)
Capacitor, Ceramic (MLCC), 3.6nF, ±5%, 50V, C0G, ±5%, SMD 0603; Manufacturer: Murata Electronics; Manufacturer Part Number: GRM1885C1H362JA01D; Package Size: 0603; JLCPCB Basic Part: No; JLCPCB Part Number: C710898; Supplier 1: LCSC; Category: Capacitors - MLCC; Supplier Part Number 1: C710898; Tolerance: ±5%; Voltage Rating: 50V; Temperature Coefficient: C0G; RoHS: Yes; ComponentLink1Description: Datasheet; ComponentLink1URL: https://wmsc.lcsc.com/wmsc/upload/file/pdf/v2/lcsc/2308111812_Murata-Electronics-GRM1885C1H362JA01D_C710898.pdf; ComponentLink2Description: JLCPCB Part URL; ComponentLink2URL: https://jlcpcb.com/partdetail/C710898; ComponentLink3Description: LCSC Part URL; ComponentLink3URL: https://lcsc.com/product-detail/Multilayer-Ceramic-Capacitors-MLCC---SMD-SMT_Murata-Electronics-Murata-Electronics-GRM1885C1H362JA01D_C710898.html
footprint CAP-0603 (0603 (1608M) Capacitor)
pins: 1, 2

## GRM1885C1H391JA01D
designator C?  Capacitance: 390pF  (hidden comment: *)
Capacitor, Ceramic (MLCC), 390pF, ±5%, null, null, ±5%, SMD 0603; Manufacturer: Murata Electronics; Manufacturer Part Number: GRM1885C1H391JA01D; Package Size: 0603; JLCPCB Basic Part: No; JLCPCB Part Number: C701309; Supplier 1: LCSC; Category: Capacitors - MLCC; Supplier Part Number 1: C701309; Tolerance: ±5%; Voltage Rating: null; Temperature Coefficient: null; RoHS: Yes; ComponentLink1Description: Datasheet; ComponentLink1URL: https://wmsc.lcsc.com/wmsc/upload/file/pdf/v2/lcsc/2304140030_Murata-Electronics-GRM1885C1H391JA01D_C701309.pdf; ComponentLink2Description: JLCPCB Part URL; ComponentLink2URL: https://jlcpcb.com/partdetail/C701309; ComponentLink3Description: LCSC Part URL; ComponentLink3URL: https://lcsc.com/product-detail/Multilayer-Ceramic-Capacitors-MLCC---SMD-SMT_Murata-Electronics-Murata-Electronics-GRM1885C1H391JA01D_C701309.html
footprint CAP-0603 (0603 (1608M) Capacitor)
pins: 1, 2

## GRM1885C1H392JA01D
designator C?  Capacitance: 3.9nF  (hidden comment: *)
Capacitor, Ceramic (MLCC), 3.9nF, ±5%, 50V, C0G, ±5%, SMD 0603; Manufacturer: Murata Electronics; Manufacturer Part Number: GRM1885C1H392JA01D; Package Size: 0603; JLCPCB Basic Part: No; JLCPCB Part Number: C415537; Supplier 1: LCSC; Category: Capacitors - MLCC; Supplier Part Number 1: C415537; Tolerance: ±5%; Voltage Rating: 50V; Temperature Coefficient: C0G; RoHS: Yes; ComponentLink1Description: Datasheet; ComponentLink1URL: https://wmsc.lcsc.com/wmsc/upload/file/pdf/v2/lcsc/2304140030_Murata-Electronics-GRM1885C1H392JA01D_C415537.pdf; ComponentLink2Description: JLCPCB Part URL; ComponentLink2URL: https://jlcpcb.com/partdetail/C415537; ComponentLink3Description: LCSC Part URL; ComponentLink3URL: https://lcsc.com/product-detail/Multilayer-Ceramic-Capacitors-MLCC---SMD-SMT_Murata-Electronics-Murata-Electronics-GRM1885C1H392JA01D_C415537.html
footprint CAP-0603 (0603 (1608M) Capacitor)
pins: 1, 2

## GRM1885C1H430JA01D
designator C?  Capacitance: 43pF  (hidden comment: *)
Capacitor, Ceramic (MLCC), 43pF, ±5%, 50V, C0G, ±5%, SMD 0603; Manufacturer: Murata Electronics; Manufacturer Part Number: GRM1885C1H430JA01D; Package Size: 0603; JLCPCB Basic Part: No; JLCPCB Part Number: C415400; Supplier 1: LCSC; Category: Capacitors - MLCC; Supplier Part Number 1: C415400; Tolerance: ±5%; Voltage Rating: 50V; Temperature Coefficient: C0G; RoHS: Yes; ComponentLink1Description: Datasheet; ComponentLink1URL: https://wmsc.lcsc.com/wmsc/upload/file/pdf/v2/lcsc/2304140030_Murata-Electronics-GRM1885C1H430JA01D_C415400.pdf; ComponentLink2Description: JLCPCB Part URL; ComponentLink2URL: https://jlcpcb.com/partdetail/C415400; ComponentLink3Description: LCSC Part URL; ComponentLink3URL: https://lcsc.com/product-detail/Multilayer-Ceramic-Capacitors-MLCC---SMD-SMT_Murata-Electronics-Murata-Electronics-GRM1885C1H430JA01D_C415400.html
footprint CAP-0603 (0603 (1608M) Capacitor)
pins: 1, 2

## GRM1885C1H431JA01D
designator C?  Capacitance: 430pF  (hidden comment: *)
Capacitor, Ceramic (MLCC), 430pF, ±5%, 50V, null, ±5%, SMD 0603; Manufacturer: Murata Electronics; Manufacturer Part Number: GRM1885C1H431JA01D; Package Size: 0603; JLCPCB Basic Part: No; JLCPCB Part Number: C440182; Supplier 1: LCSC; Category: Capacitors - MLCC; Supplier Part Number 1: C440182; Tolerance: ±5%; Voltage Rating: 50V; Temperature Coefficient: null; RoHS: Yes; ComponentLink1Description: Datasheet; ComponentLink1URL: https://wmsc.lcsc.com/wmsc/upload/file/pdf/v2/lcsc/2304140030_Murata-Electronics-GRM1885C1H431JA01D_C440182.pdf; ComponentLink2Description: JLCPCB Part URL; ComponentLink2URL: https://jlcpcb.com/partdetail/C440182; ComponentLink3Description: LCSC Part URL; ComponentLink3URL: https://lcsc.com/product-detail/Multilayer-Ceramic-Capacitors-MLCC---SMD-SMT_Murata-Electronics-Murata-Electronics-GRM1885C1H431JA01D_C440182.html
footprint CAP-0603 (0603 (1608M) Capacitor)
pins: 1, 2

## GRM1885C1H470GA01D
designator C?  Capacitance: 47pF  (hidden comment: *)
Capacitor, Ceramic (MLCC), 47pF, ±2%, 50V, C0G, ±2%, SMD 0603; Manufacturer: Murata Electronics; Manufacturer Part Number: GRM1885C1H470GA01D; Package Size: 0603; JLCPCB Basic Part: No; JLCPCB Part Number: C3909655; Supplier 1: LCSC; Category: Capacitors - MLCC; Supplier Part Number 1: C3909655; Tolerance: ±2%; Voltage Rating: 50V; Temperature Coefficient: C0G; RoHS: Yes; ComponentLink1Description: Datasheet; ComponentLink1URL: https://wmsc.lcsc.com/wmsc/upload/file/pdf/v2/lcsc/2401271300_Murata-Electronics-GRM1885C1H470GA01D_C3909655.pdf; ComponentLink2Description: JLCPCB Part URL; ComponentLink2URL: https://jlcpcb.com/partdetail/C3909655; ComponentLink3Description: LCSC Part URL; ComponentLink3URL: https://lcsc.com/product-detail/Multilayer-Ceramic-Capacitors-MLCC---SMD-SMT_Murata-Electronics-Murata-Electronics-GRM1885C1H470GA01D_C3909655.html
footprint CAP-0603 (0603 (1608M) Capacitor)
pins: 1, 2

## GRM1885C1H470JA01J
designator C?  Capacitance: 47pF  (hidden comment: *)
Capacitor, Ceramic (MLCC), 47pF, ±5%, null, null, ±5%, SMD 0603; Manufacturer: Murata Electronics; Manufacturer Part Number: GRM1885C1H470JA01J; Package Size: 0603; JLCPCB Basic Part: No; JLCPCB Part Number: C882520; Supplier 1: LCSC; Category: Capacitors - MLCC; Supplier Part Number 1: C882520; Tolerance: ±5%; Voltage Rating: null; Temperature Coefficient: null; RoHS: Yes; ComponentLink1Description: Datasheet; ComponentLink1URL: https://wmsc.lcsc.com/wmsc/upload/file/pdf/v2/lcsc/2201242130_Murata-Electronics-GRM1885C1H470JA01J_C882520.pdf; ComponentLink2Description: JLCPCB Part URL; ComponentLink2URL: https://jlcpcb.com/partdetail/C882520; ComponentLink3Description: LCSC Part URL; ComponentLink3URL: https://lcsc.com/product-detail/Multilayer-Ceramic-Capacitors-MLCC---SMD-SMT_Murata-Electronics-Murata-Electronics-GRM1885C1H470JA01J_C882520.html
footprint CAP-0603 (0603 (1608M) Capacitor)
pins: 1, 2

## GRM1885C1H471FA01D
designator C?  Capacitance: 470pF  (hidden comment: *)
Capacitor, Ceramic (MLCC), 470pF, ±1%, 50V, null, ±1%, SMD 0603; Manufacturer: Murata Electronics; Manufacturer Part Number: GRM1885C1H471FA01D; Package Size: 0603; JLCPCB Basic Part: No; JLCPCB Part Number: C162231; Supplier 1: LCSC; Category: Capacitors - MLCC; Supplier Part Number 1: C162231; Tolerance: ±1%; Voltage Rating: 50V; Temperature Coefficient: null; RoHS: Yes; ComponentLink1Description: Datasheet; ComponentLink1URL: https://wmsc.lcsc.com/wmsc/upload/file/pdf/v2/lcsc/2304140030_Murata-Electronics-GRM1885C1H471FA01D_C162231.pdf; ComponentLink2Description: JLCPCB Part URL; ComponentLink2URL: https://jlcpcb.com/partdetail/C162231; ComponentLink3Description: LCSC Part URL; ComponentLink3URL: https://lcsc.com/product-detail/Multilayer-Ceramic-Capacitors-MLCC---SMD-SMT_Murata-Electronics-Murata-Electronics-GRM1885C1H471FA01D_C162231.html
footprint CAP-0603 (0603 (1608M) Capacitor)
pins: 1, 2

## GRM1885C1H471JA01D
designator C?  Capacitance: 470pF  (hidden comment: *)
Capacitor, Ceramic (MLCC), 470pF, ±5%, 50V, C0G, ±5%, SMD 0603; Manufacturer: Murata Electronics; Manufacturer Part Number: GRM1885C1H471JA01D; Package Size: 0603; JLCPCB Basic Part: No; JLCPCB Part Number: C85979; Supplier 1: LCSC; Category: Capacitors - MLCC; Supplier Part Number 1: C85979; Tolerance: ±5%; Voltage Rating: 50V; Temperature Coefficient: C0G; RoHS: Yes; ComponentLink1Description: Datasheet; ComponentLink1URL: https://wmsc.lcsc.com/wmsc/upload/file/pdf/v2/lcsc/2304140030_Murata-Electronics-GRM1885C1H471JA01D_C85979.pdf; ComponentLink2Description: JLCPCB Part URL; ComponentLink2URL: https://jlcpcb.com/partdetail/C85979; ComponentLink3Description: LCSC Part URL; ComponentLink3URL: https://lcsc.com/product-detail/Multilayer-Ceramic-Capacitors-MLCC---SMD-SMT_Murata-Electronics-Murata-Electronics-GRM1885C1H471JA01D_C85979.html
footprint CAP-0603 (0603 (1608M) Capacitor)
pins: 1, 2

## GRM1885C1H472JA01D
designator C?  Capacitance: 4.7nF  (hidden comment: *)
Capacitor, Ceramic (MLCC), 4.7nF, ±5%, 50V, C0G, ±5%, SMD 0603; Manufacturer: Murata Electronics; Manufacturer Part Number: GRM1885C1H472JA01D; Package Size: 0603; JLCPCB Basic Part: No; JLCPCB Part Number: C85980; Supplier 1: LCSC; Category: Capacitors - MLCC; Supplier Part Number 1: C85980; Tolerance: ±5%; Voltage Rating: 50V; Temperature Coefficient: C0G; RoHS: Yes; ComponentLink1Description: Datasheet; ComponentLink1URL: https://wmsc.lcsc.com/wmsc/upload/file/pdf/v2/lcsc/2304140030_Murata-Electronics-GRM1885C1H472JA01D_C85980.pdf; ComponentLink2Description: JLCPCB Part URL; ComponentLink2URL: https://jlcpcb.com/partdetail/C85980; ComponentLink3Description: LCSC Part URL; ComponentLink3URL: https://lcsc.com/product-detail/Multilayer-Ceramic-Capacitors-MLCC---SMD-SMT_Murata-Electronics-Murata-Electronics-GRM1885C1H472JA01D_C85980.html
footprint CAP-0603 (0603 (1608M) Capacitor)
pins: 1, 2

## GRM1885C1H510JA01D
designator C?  Capacitance: 51pF  (hidden comment: *)
Capacitor, Ceramic (MLCC), 51pF, ±5%, 50V, C0G, ±5%, SMD 0603; Manufacturer: Murata Electronics; Manufacturer Part Number: GRM1885C1H510JA01D; Package Size: 0603; JLCPCB Basic Part: No; JLCPCB Part Number: C162235; Supplier 1: LCSC; Category: Capacitors - MLCC; Supplier Part Number 1: C162235; Tolerance: ±5%; Voltage Rating: 50V; Temperature Coefficient: C0G; RoHS: Yes; ComponentLink1Description: Datasheet; ComponentLink1URL: https://wmsc.lcsc.com/wmsc/upload/file/pdf/v2/lcsc/1912111437_Murata-Electronics-GRM1885C1H510JA01D_C162235.pdf; ComponentLink2Description: JLCPCB Part URL; ComponentLink2URL: https://jlcpcb.com/partdetail/C162235; ComponentLink3Description: LCSC Part URL; ComponentLink3URL: https://lcsc.com/product-detail/Multilayer-Ceramic-Capacitors-MLCC---SMD-SMT_Murata-Electronics-Murata-Electronics-GRM1885C1H510JA01D_C162235.html
footprint CAP-0603 (0603 (1608M) Capacitor)
pins: 1, 2

## GRM1885C1H511JA01D
designator C?  Capacitance: 510pF  (hidden comment: *)
Capacitor, Ceramic (MLCC), 510pF, ±5%, null, null, ±5%, SMD 0603; Manufacturer: Murata Electronics; Manufacturer Part Number: GRM1885C1H511JA01D; Package Size: 0603; JLCPCB Basic Part: No; JLCPCB Part Number: C882519; Supplier 1: LCSC; Category: Capacitors - MLCC; Supplier Part Number 1: C882519; Tolerance: ±5%; Voltage Rating: null; Temperature Coefficient: null; RoHS: Yes; ComponentLink1Description: Datasheet; ComponentLink1URL: https://wmsc.lcsc.com/wmsc/upload/file/pdf/v2/lcsc/2304140030_Murata-Electronics-GRM1885C1H511JA01D_C882519.pdf; ComponentLink2Description: JLCPCB Part URL; ComponentLink2URL: https://jlcpcb.com/partdetail/C882519; ComponentLink3Description: LCSC Part URL; ComponentLink3URL: https://lcsc.com/product-detail/Multilayer-Ceramic-Capacitors-MLCC---SMD-SMT_Murata-Electronics-Murata-Electronics-GRM1885C1H511JA01D_C882519.html
footprint CAP-0603 (0603 (1608M) Capacitor)
pins: 1, 2

## GRM1885C1H560FA01D
designator C?  Capacitance: 56pF  (hidden comment: *)
Capacitor, Ceramic (MLCC), 56pF, ±1%, 50V, C0G, ±1%, SMD 0603; Manufacturer: Murata Electronics; Manufacturer Part Number: GRM1885C1H560FA01D; Package Size: 0603; JLCPCB Basic Part: No; JLCPCB Part Number: C524620; Supplier 1: LCSC; Category: Capacitors - MLCC; Supplier Part Number 1: C524620; Tolerance: ±1%; Voltage Rating: 50V; Temperature Coefficient: C0G; RoHS: Yes; ComponentLink1Description: Datasheet; ComponentLink1URL: https://wmsc.lcsc.com/wmsc/upload/file/pdf/v2/lcsc/2304140030_Murata-Electronics-GRM1885C1H560FA01D_C524620.pdf; ComponentLink2Description: JLCPCB Part URL; ComponentLink2URL: https://jlcpcb.com/partdetail/C524620; ComponentLink3Description: LCSC Part URL; ComponentLink3URL: https://lcsc.com/product-detail/Multilayer-Ceramic-Capacitors-MLCC---SMD-SMT_Murata-Electronics-Murata-Electronics-GRM1885C1H560FA01D_C524620.html
footprint CAP-0603 (0603 (1608M) Capacitor)
pins: 1, 2

## GRM1885C1H561FA01D
designator C?  Capacitance: 560pF  (hidden comment: *)
Capacitor, Ceramic (MLCC), 560pF, ±1%, 50V, C0G, ±1%, SMD 0603; Manufacturer: Murata Electronics; Manufacturer Part Number: GRM1885C1H561FA01D; Package Size: 0603; JLCPCB Basic Part: No; JLCPCB Part Number: C415532; Supplier 1: LCSC; Category: Capacitors - MLCC; Supplier Part Number 1: C415532; Tolerance: ±1%; Voltage Rating: 50V; Temperature Coefficient: C0G; RoHS: Yes; ComponentLink1Description: Datasheet; ComponentLink1URL: https://wmsc.lcsc.com/wmsc/upload/file/pdf/v2/lcsc/2304140030_Murata-Electronics-GRM1885C1H561FA01D_C415532.pdf; ComponentLink2Description: JLCPCB Part URL; ComponentLink2URL: https://jlcpcb.com/partdetail/C415532; ComponentLink3Description: LCSC Part URL; ComponentLink3URL: https://lcsc.com/product-detail/Multilayer-Ceramic-Capacitors-MLCC---SMD-SMT_Murata-Electronics-Murata-Electronics-GRM1885C1H561FA01D_C415532.html
footprint CAP-0603 (0603 (1608M) Capacitor)
pins: 1, 2